# Altium schematic symbol library jlcpcb_2025_04_capacitors_extended_0201.schlib: 1175 symbols (part 6 of 7) (continued)
## GRM0335C1H820JA01D
designator C?  Capacitance: 82pF  (hidden comment: *)
Capacitor, Ceramic (MLCC), 82pF, ±5%, 50V, C0G, ±5%, SMD 0201; Manufacturer: Murata Electronics; Manufacturer Part Number: GRM0335C1H820JA01D; Package Size: 0201; JLCPCB Basic Part: No; JLCPCB Part Number: C161439; Supplier 1: LCSC; Category: Capacitors - MLCC; Supplier Part Number 1: C161439; Tolerance: ±5%; Voltage Rating: 50V; Temperature Coefficient: C0G; RoHS: Yes; ComponentLink1Description: Datasheet; ComponentLink1URL: https://wmsc.lcsc.com/wmsc/upload/file/pdf/v2/lcsc/2304140030_Murata-Electronics-GRM0335C1H820JA01D_C161439.pdf; ComponentLink2Description: JLCPCB Part URL; ComponentLink2URL: https://jlcpcb.com/partdetail/C161439; ComponentLink3Description: LCSC Part URL; ComponentLink3URL: https://lcsc.com/product-detail/Multilayer-Ceramic-Capacitors-MLCC---SMD-SMT_Murata-Electronics-Murata-Electronics-GRM0335C1H820JA01D_C161439.html
footprint CAP-0201 (0201 (0603M) Capacitor)
pins: 1, 2

## GRM0335C1H821JE01D
designator C?  Capacitance: 820pF  (hidden comment: *)
Capacitor, Ceramic (MLCC), 820pF, ±5%, null, null, ±5%, SMD 0201; Manufacturer: Murata Electronics; Manufacturer Part Number: GRM0335C1H821JE01D; Package Size: 0201; JLCPCB Basic Part: No; JLCPCB Part Number: C883565; Supplier 1: LCSC; Category: Capacitors - MLCC; Supplier Part Number 1: C883565; Tolerance: ±5%; Voltage Rating: null; Temperature Coefficient: null; RoHS: Yes; ComponentLink1Description: Datasheet; ComponentLink1URL: https://wmsc.lcsc.com/wmsc/upload/file/pdf/v2/lcsc/2304140030_Murata-Electronics-GRM0335C1H821JE01D_C883565.pdf; ComponentLink2Description: JLCPCB Part URL; ComponentLink2URL: https://jlcpcb.com/partdetail/C883565; ComponentLink3Description: LCSC Part URL; ComponentLink3URL: https://lcsc.com/product-detail/Multilayer-Ceramic-Capacitors-MLCC---SMD-SMT_Murata-Electronics-Murata-Electronics-GRM0335C1H821JE01D_C883565.html
footprint CAP-0201 (0201 (0603M) Capacitor)
pins: 1, 2

## GRM0335C1H910GA01D
designator C?  Capacitance: 91pF  (hidden comment: *)
Capacitor, Ceramic (MLCC), 91pF, ±2%, null, null, ±2%, SMD 0201; Manufacturer: Murata Electronics; Manufacturer Part Number: GRM0335C1H910GA01D; Package Size: 0201; JLCPCB Basic Part: No; JLCPCB Part Number: C710811; Supplier 1: LCSC; Category: Capacitors - MLCC; Supplier Part Number 1: C710811; Tolerance: ±2%; Voltage Rating: null; Temperature Coefficient: null; RoHS: Yes; ComponentLink1Description: Datasheet; ComponentLink1URL: https://wmsc.lcsc.com/wmsc/upload/file/pdf/v2/lcsc/2009181535_Murata-Electronics-GRM0335C1H910GA01D_C710811.pdf; ComponentLink2Description: JLCPCB Part URL; ComponentLink2URL: https://jlcpcb.com/partdetail/C710811; ComponentLink3Description: LCSC Part URL; ComponentLink3URL: https://lcsc.com/product-detail/Multilayer-Ceramic-Capacitors-MLCC---SMD-SMT_Murata-Electronics-Murata-Electronics-GRM0335C1H910GA01D_C710811.html
footprint CAP-0201 (0201 (0603M) Capacitor)
pins: 1, 2

## GRM0335C1HR20BA01D
designator C?  Capacitance: 0.2pF  (hidden comment: *)
Capacitor, Ceramic (MLCC), 0.2pF, 50V, C0G, SMD 0201; Manufacturer: Murata Electronics; Manufacturer Part Number: GRM0335C1HR20BA01D; Package Size: 0201; JLCPCB Basic Part: No; JLCPCB Part Number: C161446; Supplier 1: LCSC; Category: Capacitors - MLCC; Supplier Part Number 1: C161446; Voltage Rating: 50V; Temperature Coefficient: C0G; RoHS: Yes; ComponentLink1Description: Datasheet; ComponentLink1URL: https://wmsc.lcsc.com/wmsc/upload/file/pdf/v2/lcsc/1811081547_Murata-Electronics-GRM0335C1HR20BA01D_C161446.pdf; ComponentLink2Description: JLCPCB Part URL; ComponentLink2URL: https://jlcpcb.com/partdetail/C161446; ComponentLink3Description: LCSC Part URL; ComponentLink3URL: https://lcsc.com/product-detail/Multilayer-Ceramic-Capacitors-MLCC---SMD-SMT_Murata-Electronics-Murata-Electronics-GRM0335C1HR20BA01D_C161446.html
footprint CAP-0201 (0201 (0603M) Capacitor)
pins: 1, 2

## GRM0335C1HR20WA01D
designator C?  Capacitance: 0.2pF  (hidden comment: *)
Capacitor, Ceramic (MLCC), 0.2pF, null, null, SMD 0201; Manufacturer: Murata Electronics; Manufacturer Part Number: GRM0335C1HR20WA01D; Package Size: 0201; JLCPCB Basic Part: No; JLCPCB Part Number: C385010; Supplier 1: LCSC; Category: Capacitors - MLCC; Supplier Part Number 1: C385010; Voltage Rating: null; Temperature Coefficient: null; RoHS: Yes; ComponentLink1Description: Datasheet; ComponentLink1URL: https://wmsc.lcsc.com/wmsc/upload/file/pdf/v2/lcsc/2010302038_Murata-Electronics-GRM0335C1HR20WA01D_C385010.pdf; ComponentLink2Description: JLCPCB Part URL; ComponentLink2URL: https://jlcpcb.com/partdetail/C385010; ComponentLink3Description: LCSC Part URL; ComponentLink3URL: https://lcsc.com/product-detail/Multilayer-Ceramic-Capacitors-MLCC---SMD-SMT_Murata-Electronics-Murata-Electronics-GRM0335C1HR20WA01D_C385010.html
footprint CAP-0201 (0201 (0603M) Capacitor)
pins: 1, 2

## GRM0335C1HR30BA01D
designator C?  Capacitance: 0.3pF  (hidden comment: *)
Capacitor, Ceramic (MLCC), 0.3pF, 50V, C0G, SMD 0201; Manufacturer: Murata Electronics; Manufacturer Part Number: GRM0335C1HR30BA01D; Package Size: 0201; JLCPCB Basic Part: No; JLCPCB Part Number: C76927; Supplier 1: LCSC; Category: Capacitors - MLCC; Supplier Part Number 1: C76927; Voltage Rating: 50V; Temperature Coefficient: C0G; RoHS: Yes; ComponentLink1Description: Datasheet; ComponentLink1URL: https://wmsc.lcsc.com/wmsc/upload/file/pdf/v2/lcsc/1811081513_Murata-Electronics-GRM0335C1HR30BA01D_C76927.pdf; ComponentLink2Description: JLCPCB Part URL; ComponentLink2URL: https://jlcpcb.com/partdetail/C76927; ComponentLink3Description: LCSC Part URL; ComponentLink3URL: https://lcsc.com/product-detail/Multilayer-Ceramic-Capacitors-MLCC---SMD-SMT_Murata-Electronics-Murata-Electronics-GRM0335C1HR30BA01D_C76927.html
footprint CAP-0201 (0201 (0603M) Capacitor)
pins: 1, 2

## GRM0335C1HR30WA01D
designator C?  Capacitance: 0.3pF  (hidden comment: *)
Capacitor, Ceramic (MLCC), 0.3pF, 50V, C0G, SMD 0201; Manufacturer: Murata Electronics; Manufacturer Part Number: GRM0335C1HR30WA01D; Package Size: 0201; JLCPCB Basic Part: No; JLCPCB Part Number: C85919; Supplier 1: LCSC; Category: Capacitors - MLCC; Supplier Part Number 1: C85919; Voltage Rating: 50V; Temperature Coefficient: C0G; RoHS: Yes; ComponentLink1Description: Datasheet; ComponentLink1URL: https://wmsc.lcsc.com/wmsc/upload/file/pdf/v2/lcsc/2304140030_Murata-Electronics-GRM0335C1HR30WA01D_C85919.pdf; ComponentLink2Description: JLCPCB Part URL; ComponentLink2URL: https://jlcpcb.com/partdetail/C85919; ComponentLink3Description: LCSC Part URL; ComponentLink3URL: https://lcsc.com/product-detail/Multilayer-Ceramic-Capacitors-MLCC---SMD-SMT_Murata-Electronics-Murata-Electronics-GRM0335C1HR30WA01D_C85919.html
footprint CAP-0201 (0201 (0603M) Capacitor)
pins: 1, 2

## GRM0335C1HR40BA01D
designator C?  Capacitance: 0.4pF  (hidden comment: *)
Capacitor, Ceramic (MLCC), 0.4pF, 50V, C0G, SMD 0201; Manufacturer: Murata Electronics; Manufacturer Part Number: GRM0335C1HR40BA01D; Package Size: 0201; JLCPCB Basic Part: No; JLCPCB Part Number: C161447; Supplier 1: LCSC; Category: Capacitors - MLCC; Supplier Part Number 1: C161447; Voltage Rating: 50V; Temperature Coefficient: C0G; RoHS: Yes; ComponentLink1Description: Datasheet; ComponentLink1URL: https://wmsc.lcsc.com/wmsc/upload/file/pdf/v2/lcsc/1811081551_Murata-Electronics-GRM0335C1HR40BA01D_C161447.pdf; ComponentLink2Description: JLCPCB Part URL; ComponentLink2URL: https://jlcpcb.com/partdetail/C161447; ComponentLink3Description: LCSC Part URL; ComponentLink3URL: https://lcsc.com/product-detail/Multilayer-Ceramic-Capacitors-MLCC---SMD-SMT_Murata-Electronics-Murata-Electronics-GRM0335C1HR40BA01D_C161447.html
footprint CAP-0201 (0201 (0603M) Capacitor)
pins: 1, 2

## GRM0335C1HR40WA01D
designator C?  Capacitance: 0.4pF  (hidden comment: *)
Capacitor, Ceramic (MLCC), 0.4pF, 50V, C0G, SMD 0201; Manufacturer: Murata Electronics; Manufacturer Part Number: GRM0335C1HR40WA01D; Package Size: 0201; JLCPCB Basic Part: No; JLCPCB Part Number: C385011; Supplier 1: LCSC; Category: Capacitors - MLCC; Supplier Part Number 1: C385011; Voltage Rating: 50V; Temperature Coefficient: C0G; RoHS: Yes; ComponentLink1Description: Datasheet; ComponentLink1URL: https://wmsc.lcsc.com/wmsc/upload/file/pdf/v2/lcsc/2108182030_Murata-Electronics-GRM0335C1HR40WA01D_C385011.pdf; ComponentLink2Description: JLCPCB Part URL; ComponentLink2URL: https://jlcpcb.com/partdetail/C385011; ComponentLink3Description: LCSC Part URL; ComponentLink3URL: https://lcsc.com/product-detail/Multilayer-Ceramic-Capacitors-MLCC---SMD-SMT_Murata-Electronics-Murata-Electronics-GRM0335C1HR40WA01D_C385011.html
footprint CAP-0201 (0201 (0603M) Capacitor)
pins: 1, 2

## GRM0335C1HR50BA01D
designator C?  Capacitance: 0.5pF  (hidden comment: *)
Capacitor, Ceramic (MLCC), 0.5pF, 50V, C0G, SMD 0201; Manufacturer: Murata Electronics; Manufacturer Part Number: GRM0335C1HR50BA01D; Package Size: 0201; JLCPCB Basic Part: No; JLCPCB Part Number: C85920; Supplier 1: LCSC; Category: Capacitors - MLCC; Supplier Part Number 1: C85920; Voltage Rating: 50V; Temperature Coefficient: C0G; RoHS: Yes; ComponentLink1Description: Datasheet; ComponentLink1URL: https://wmsc.lcsc.com/wmsc/upload/file/pdf/v2/lcsc/2304140030_Murata-Electronics-GRM0335C1HR50BA01D_C85920.pdf; ComponentLink2Description: JLCPCB Part URL; ComponentLink2URL: https://jlcpcb.com/partdetail/C85920; ComponentLink3Description: LCSC Part URL; ComponentLink3URL: https://lcsc.com/product-detail/Multilayer-Ceramic-Capacitors-MLCC---SMD-SMT_Murata-Electronics-Murata-Electronics-GRM0335C1HR50BA01D_C85920.html
footprint CAP-0201 (0201 (0603M) Capacitor)
pins: 1, 2

## GRM0335C1HR50WA01D
designator C?  Capacitance: 0.5pF  (hidden comment: *)
Capacitor, Ceramic (MLCC), 0.5pF, 50V, C0G, SMD 0201; Manufacturer: Murata Electronics; Manufacturer Part Number: GRM0335C1HR50WA01D; Package Size: 0201; JLCPCB Basic Part: No; JLCPCB Part Number: C85922; Supplier 1: LCSC; Category: Capacitors - MLCC; Supplier Part Number 1: C85922; Voltage Rating: 50V; Temperature Coefficient: C0G; RoHS: Yes; ComponentLink1Description: Datasheet; ComponentLink1URL: https://wmsc.lcsc.com/wmsc/upload/file/pdf/v2/lcsc/2304140030_Murata-Electronics-GRM0335C1HR50WA01D_C85922.pdf; ComponentLink2Description: JLCPCB Part URL; ComponentLink2URL: https://jlcpcb.com/partdetail/C85922; ComponentLink3Description: LCSC Part URL; ComponentLink3URL: https://lcsc.com/product-detail/Multilayer-Ceramic-Capacitors-MLCC---SMD-SMT_Murata-Electronics-Murata-Electronics-GRM0335C1HR50WA01D_C85922.html
footprint CAP-0201 (0201 (0603M) Capacitor)
pins: 1, 2

## GRM0335C1HR60BA01D
designator C?  Capacitance: 0.6pF  (hidden comment: *)
Capacitor, Ceramic (MLCC), 0.6pF, 50V, C0G, SMD 0201; Manufacturer: Murata Electronics; Manufacturer Part Number: GRM0335C1HR60BA01D; Package Size: 0201; JLCPCB Basic Part: No; JLCPCB Part Number: C161448; Supplier 1: LCSC; Category: Capacitors - MLCC; Supplier Part Number 1: C161448; Voltage Rating: 50V; Temperature Coefficient: C0G; RoHS: Yes; ComponentLink1Description: Datasheet; ComponentLink1URL: https://wmsc.lcsc.com/wmsc/upload/file/pdf/v2/lcsc/1811081551_Murata-Electronics-GRM0335C1HR60BA01D_C161448.pdf; ComponentLink2Description: JLCPCB Part URL; ComponentLink2URL: https://jlcpcb.com/partdetail/C161448; ComponentLink3Description: LCSC Part URL; ComponentLink3URL: https://lcsc.com/product-detail/Multilayer-Ceramic-Capacitors-MLCC---SMD-SMT_Murata-Electronics-Murata-Electronics-GRM0335C1HR60BA01D_C161448.html
footprint CAP-0201 (0201 (0603M) Capacitor)
pins: 1, 2

## GRM0335C1HR60WA01D
designator C?  Capacitance: 0.6pF  (hidden comment: *)
Capacitor, Ceramic (MLCC), 0.6pF, null, null, SMD 0201; Manufacturer: Murata Electronics; Manufacturer Part Number: GRM0335C1HR60WA01D; Package Size: 0201; JLCPCB Basic Part: No; JLCPCB Part Number: C361058; Supplier 1: LCSC; Category: Capacitors - MLCC; Supplier Part Number 1: C361058; Voltage Rating: null; Temperature Coefficient: null; RoHS: Yes; ComponentLink1Description: Datasheet; ComponentLink1URL: https://wmsc.lcsc.com/wmsc/upload/file/pdf/v2/lcsc/2101081032_Murata-Electronics-GRM0335C1HR60WA01D_C361058.pdf; ComponentLink2Description: JLCPCB Part URL; ComponentLink2URL: https://jlcpcb.com/partdetail/C361058; ComponentLink3Description: LCSC Part URL; ComponentLink3URL: https://lcsc.com/product-detail/Multilayer-Ceramic-Capacitors-MLCC---SMD-SMT_Murata-Electronics-Murata-Electronics-GRM0335C1HR60WA01D_C361058.html
footprint CAP-0201 (0201 (0603M) Capacitor)
pins: 1, 2

## GRM0335C1HR70BA01D
designator C?  Capacitance: 0.7pF  (hidden comment: *)
Capacitor, Ceramic (MLCC), 0.7pF, 50V, C0G, SMD 0201; Manufacturer: Murata Electronics; Manufacturer Part Number: GRM0335C1HR70BA01D; Package Size: 0201; JLCPCB Basic Part: No; JLCPCB Part Number: C237538; Supplier 1: LCSC; Category: Capacitors - MLCC; Supplier Part Number 1: C237538; Voltage Rating: 50V; Temperature Coefficient: C0G; RoHS: Yes; ComponentLink1Description: Datasheet; ComponentLink1URL: https://wmsc.lcsc.com/wmsc/upload/file/pdf/v2/lcsc/2304140030_Murata-Electronics-GRM0335C1HR70BA01D_C237538.pdf; ComponentLink2Description: JLCPCB Part URL; ComponentLink2URL: https://jlcpcb.com/partdetail/C237538; ComponentLink3Description: LCSC Part URL; ComponentLink3URL: https://lcsc.com/product-detail/Multilayer-Ceramic-Capacitors-MLCC---SMD-SMT_Murata-Electronics-Murata-Electronics-GRM0335C1HR70BA01D_C237538.html
footprint CAP-0201 (0201 (0603M) Capacitor)
pins: 1, 2

## GRM0335C1HR70WA01D
designator C?  Capacitance: 0.7pF  (hidden comment: *)
Capacitor, Ceramic (MLCC), 0.7pF, 50V, C0G, SMD 0201; Manufacturer: Murata Electronics; Manufacturer Part Number: GRM0335C1HR70WA01D; Package Size: 0201; JLCPCB Basic Part: No; JLCPCB Part Number: C161449; Supplier 1: LCSC; Category: Capacitors - MLCC; Supplier Part Number 1: C161449; Voltage Rating: 50V; Temperature Coefficient: C0G; RoHS: Yes; ComponentLink1Description: Datasheet; ComponentLink1URL: https://wmsc.lcsc.com/wmsc/upload/file/pdf/v2/lcsc/2304140030_Murata-Electronics-GRM0335C1HR70WA01D_C161449.pdf; ComponentLink2Description: JLCPCB Part URL; ComponentLink2URL: https://jlcpcb.com/partdetail/C161449; ComponentLink3Description: LCSC Part URL; ComponentLink3URL: https://lcsc.com/product-detail/Multilayer-Ceramic-Capacitors-MLCC---SMD-SMT_Murata-Electronics-Murata-Electronics-GRM0335C1HR70WA01D_C161449.html
footprint CAP-0201 (0201 (0603M) Capacitor)
pins: 1, 2

## GRM0335C1HR75BA01D
designator C?  Capacitance: 0.75pF  (hidden comment: *)
Capacitor, Ceramic (MLCC), 0.75pF, 50V, null, SMD 0201; Manufacturer: Murata Electronics; Manufacturer Part Number: GRM0335C1HR75BA01D; Package Size: 0201; JLCPCB Basic Part: No; JLCPCB Part Number: C2171630; Supplier 1: LCSC; Category: Capacitors - MLCC; Supplier Part Number 1: C2171630; Voltage Rating: 50V; Temperature Coefficient: null; RoHS: Yes; ComponentLink1Description: Datasheet; ComponentLink1URL: https://wmsc.lcsc.com/wmsc/upload/file/pdf/v2/lcsc/2308111543_Murata-Electronics-GRM0335C1HR75BA01D_C2171630.pdf; ComponentLink2Description: JLCPCB Part URL; ComponentLink2URL: https://jlcpcb.com/partdetail/C2171630; ComponentLink3Description: LCSC Part URL; ComponentLink3URL: https://lcsc.com/product-detail/Multilayer-Ceramic-Capacitors-MLCC---SMD-SMT_Murata-Electronics-Murata-Electronics-GRM0335C1HR75BA01D_C2171630.html
footprint CAP-0201 (0201 (0603M) Capacitor)
pins: 1, 2

## GRM0335C1HR80BA01D
designator C?  Capacitance: 0.8pF  (hidden comment: *)
Capacitor, Ceramic (MLCC), 0.8pF, 50V, C0G, SMD 0201; Manufacturer: Murata Electronics; Manufacturer Part Number: GRM0335C1HR80BA01D; Package Size: 0201; JLCPCB Basic Part: No; JLCPCB Part Number: C161450; Supplier 1: LCSC; Category: Capacitors - MLCC; Supplier Part Number 1: C161450; Voltage Rating: 50V; Temperature Coefficient: C0G; RoHS: Yes; ComponentLink1Description: Datasheet; ComponentLink1URL: https://wmsc.lcsc.com/wmsc/upload/file/pdf/v2/lcsc/2304140030_Murata-Electronics-GRM0335C1HR80BA01D_C161450.pdf; ComponentLink2Description: JLCPCB Part URL; ComponentLink2URL: https://jlcpcb.com/partdetail/C161450; ComponentLink3Description: LCSC Part URL; ComponentLink3URL: https://lcsc.com/product-detail/Multilayer-Ceramic-Capacitors-MLCC---SMD-SMT_Murata-Electronics-Murata-Electronics-GRM0335C1HR80BA01D_C161450.html
footprint CAP-0201 (0201 (0603M) Capacitor)
pins: 1, 2

## GRM0335C1HR80WA01D
designator C?  Capacitance: 0.8pF  (hidden comment: *)
Capacitor, Ceramic (MLCC), 0.8pF, SMD 0201; Manufacturer: Murata Electronics; Manufacturer Part Number: GRM0335C1HR80WA01D; Package Size: 0201; JLCPCB Basic Part: No; JLCPCB Part Number: C385012; Supplier 1: LCSC; Category: Capacitors - MLCC; Supplier Part Number 1: C385012; RoHS: Yes; ComponentLink1Description: Datasheet; ComponentLink1URL: https://wmsc.lcsc.com/wmsc/upload/file/pdf/v2/lcsc/2011141507_Murata-Electronics-GRM0335C1HR80WA01D_C385012.pdf; ComponentLink2Description: JLCPCB Part URL; ComponentLink2URL: https://jlcpcb.com/partdetail/C385012; ComponentLink3Description: LCSC Part URL; ComponentLink3URL: https://lcsc.com/product-detail/Multilayer-Ceramic-Capacitors-MLCC---SMD-SMT_Murata-Electronics-Murata-Electronics-GRM0335C1HR80WA01D_C385012.html
footprint CAP-0201 (0201 (0603M) Capacitor)
pins: 1, 2

## GRM0335C1HR90WA01D
designator C?  Capacitance: 0.9pF  (hidden comment: *)
Capacitor, Ceramic (MLCC), 0.9pF, null, null, SMD 0201; Manufacturer: Murata Electronics; Manufacturer Part Number: GRM0335C1HR90WA01D; Package Size: 0201; JLCPCB Basic Part: No; JLCPCB Part Number: C385013; Supplier 1: LCSC; Category: Capacitors - MLCC; Supplier Part Number 1: C385013; Voltage Rating: null; Temperature Coefficient: null; RoHS: Yes; ComponentLink1Description: Datasheet; ComponentLink1URL: https://wmsc.lcsc.com/wmsc/upload/file/pdf/v2/lcsc/2308111631_Murata-Electronics-GRM0335C1HR90WA01D_C385013.pdf; ComponentLink2Description: JLCPCB Part URL; ComponentLink2URL: https://jlcpcb.com/partdetail/C385013; ComponentLink3Description: LCSC Part URL; ComponentLink3URL: https://lcsc.com/product-detail/Multilayer-Ceramic-Capacitors-MLCC---SMD-SMT_Murata-Electronics-Murata-Electronics-GRM0335C1HR90WA01D_C385013.html
footprint CAP-0201 (0201 (0603M) Capacitor)
pins: 1, 2

## GRM0335C2A101JA01D
designator C?  Capacitance: 100pF  (hidden comment: *)
Capacitor, Ceramic (MLCC), 100pF, ±5%, 100V, C0G, ±5%, SMD 0201; Manufacturer: Murata Electronics; Manufacturer Part Number: GRM0335C2A101JA01D; Package Size: 0201; JLCPCB Basic Part: No; JLCPCB Part Number: C161452; Supplier 1: LCSC; Category: Capacitors - MLCC; Supplier Part Number 1: C161452; Tolerance: ±5%; Voltage Rating: 100V; Temperature Coefficient: C0G; RoHS: Yes; ComponentLink1Description: Datasheet; ComponentLink1URL: https://wmsc.lcsc.com/wmsc/upload/file/pdf/v2/lcsc/2308111631_Murata-Electronics-GRM0335C2A101JA01D_C161452.pdf; ComponentLink2Description: JLCPCB Part URL; ComponentLink2URL: https://jlcpcb.com/partdetail/C161452; ComponentLink3Description: LCSC Part URL; ComponentLink3URL: https://lcsc.com/product-detail/Multilayer-Ceramic-Capacitors-MLCC---SMD-SMT_Murata-Electronics-Murata-Electronics-GRM0335C2A101JA01D_C161452.html
footprint CAP-0201 (0201 (0603M) Capacitor)
pins: 1, 2

## GRM0335C2AR20WA01D
designator C?  Capacitance: 0.2pF  (hidden comment: *)
Capacitor, Ceramic (MLCC), 0.2pF, 100V, null, SMD 0201; Manufacturer: Murata Electronics; Manufacturer Part Number: GRM0335C2AR20WA01D; Package Size: 0201; JLCPCB Basic Part: No; JLCPCB Part Number: C913492; Supplier 1: LCSC; Category: Capacitors - MLCC; Supplier Part Number 1: C913492; Voltage Rating: 100V; Temperature Coefficient: null; RoHS: Yes; ComponentLink1Description: Datasheet; ComponentLink1URL: https://wmsc.lcsc.com/wmsc/upload/file/pdf/v2/lcsc/2201131300_Murata-Electronics-GRM0335C2AR20WA01D_C913492.pdf; ComponentLink2Description: JLCPCB Part URL; ComponentLink2URL: https://jlcpcb.com/partdetail/C913492; ComponentLink3Description: LCSC Part URL; ComponentLink3URL: https://lcsc.com/product-detail/Multilayer-Ceramic-Capacitors-MLCC---SMD-SMT_Murata-Electronics-Murata-Electronics-GRM0335C2AR20WA01D_C913492.html
footprint CAP-0201 (0201 (0603M) Capacitor)
pins: 1, 2

## GRT033C71A104KE01D
designator C?  Capacitance: 100nF  (hidden comment: *)
Capacitor, Ceramic (MLCC), 100nF, ±10%, 10V, X7S, ±10%, SMD 0201; Manufacturer: Murata Electronics; Manufacturer Part Number: GRT033C71A104KE01D; Package Size: 0201; JLCPCB Basic Part: No; JLCPCB Part Number: C3845735; Supplier 1: LCSC; Category: Capacitors - MLCC; Supplier Part Number 1: C3845735; Tolerance: ±10%; Voltage Rating: 10V; Temperature Coefficient: X7S; RoHS: Yes; ComponentLink1Description: Datasheet; ComponentLink1URL: https://wmsc.lcsc.com/wmsc/upload/file/pdf/v2/lcsc/2308111522_Murata-Electronics-GRT033C71A104KE01D_C3845735.pdf; ComponentLink2Description: JLCPCB Part URL; ComponentLink2URL: https://jlcpcb.com/partdetail/C3845735; ComponentLink3Description: LCSC Part URL; ComponentLink3URL: https://lcsc.com/product-detail/Multilayer-Ceramic-Capacitors-MLCC---SMD-SMT_Murata-Electronics-Murata-Electronics-GRT033C71A104KE01D_C3845735.html
footprint CAP-0201 (0201 (0603M) Capacitor)
pins: 1, 2

## GRT033C71C104KE01D
designator C?  Capacitance: 100nF  (hidden comment: *)
Capacitor, Ceramic (MLCC), 100nF, ±10%, 16V, X7T, ±10%, SMD 0201; Manufacturer: Murata Electronics; Manufacturer Part Number: GRT033C71C104KE01D; Package Size: 0201; JLCPCB Basic Part: No; JLCPCB Part Number: C1517580; Supplier 1: LCSC; Category: Capacitors - MLCC; Supplier Part Number 1: C1517580; Tolerance: ±10%; Voltage Rating: 16V; Temperature Coefficient: X7T; RoHS: Yes; ComponentLink1Description: Datasheet; ComponentLink1URL: https://wmsc.lcsc.com/wmsc/upload/file/pdf/v2/lcsc/2111181830_Murata-Electronics-GRT033C71C104KE01D_C1517580.pdf; ComponentLink2Description: JLCPCB Part URL; ComponentLink2URL: https://jlcpcb.com/partdetail/C1517580; ComponentLink3Description: LCSC Part URL; ComponentLink3URL: https://lcsc.com/product-detail/Multilayer-Ceramic-Capacitors-MLCC---SMD-SMT_Murata-Electronics-Murata-Electronics-GRT033C71C104KE01D_C1517580.html
footprint CAP-0201 (0201 (0603M) Capacitor)
pins: 1, 2

## GRT033C80J104KE01D
designator C?  Capacitance: 100nF  (hidden comment: *)
Capacitor, Ceramic (MLCC), 100nF, ±10%, 6.3V, ±10%, SMD 0201; Manufacturer: Murata Electronics; Manufacturer Part Number: GRT033C80J104KE01D; Package Size: 0201; JLCPCB Basic Part: No; JLCPCB Part Number: C907724; Supplier 1: LCSC; Category: Capacitors - MLCC; Supplier Part Number 1: C907724; Tolerance: ±10%; Voltage Rating: 6.3V; RoHS: Yes; ComponentLink1Description: Datasheet; ComponentLink1URL: https://wmsc.lcsc.com/wmsc/upload/file/pdf/v2/lcsc/2304140030_Murata-Electronics-GRT033C80J104KE01D_C907724.pdf; ComponentLink2Description: JLCPCB Part URL; ComponentLink2URL: https://jlcpcb.com/partdetail/C907724; ComponentLink3Description: LCSC Part URL; ComponentLink3URL: https://lcsc.com/product-detail/Multilayer-Ceramic-Capacitors-MLCC---SMD-SMT_Murata-Electronics-Murata-Electronics-GRT033C80J104KE01D_C907724.html
footprint CAP-0201 (0201 (0603M) Capacitor)
pins: 1, 2

## GRT033C80J224KE01D
designator C?  Capacitance: 220nF  (hidden comment: *)
Capacitor, Ceramic (MLCC), 220nF, ±10%, 6.3V, X6S, ±10%, SMD 0201; Manufacturer: Murata Electronics; Manufacturer Part Number: GRT033C80J224KE01D; Package Size: 0201; JLCPCB Basic Part: No; JLCPCB Part Number: C711069; Supplier 1: LCSC; Category: Capacitors - MLCC; Supplier Part Number 1: C711069; Tolerance: ±10%; Voltage Rating: 6.3V; Temperature Coefficient: X6S; RoHS: Yes; ComponentLink1Description: Datasheet; ComponentLink1URL: https://wmsc.lcsc.com/wmsc/upload/file/pdf/v2/lcsc/2206281745_Murata-Electronics-GRT033C80J224KE01D_C711069.pdf; ComponentLink2Description: JLCPCB Part URL; ComponentLink2URL: https://jlcpcb.com/partdetail/C711069; ComponentLink3Description: LCSC Part URL; ComponentLink3URL: https://lcsc.com/product-detail/Multilayer-Ceramic-Capacitors-MLCC---SMD-SMT_Murata-Electronics-Murata-Electronics-GRT033C80J224KE01D_C711069.html
footprint CAP-0201 (0201 (0603M) Capacitor)
pins: 1, 2

## GRT033C81A104KE01D
designator C?  Capacitance: 100nF  (hidden comment: *)
Capacitor, Ceramic (MLCC), 100nF, ±10%, 10V, X6S, ±10%, SMD 0201; Manufacturer: Murata Electronics; Manufacturer Part Number: GRT033C81A104KE01D; Package Size: 0201; JLCPCB Basic Part: No; JLCPCB Part Number: C711070; Supplier 1: LCSC; Category: Capacitors - MLCC; Supplier Part Number 1: C711070; Tolerance: ±10%; Voltage Rating: 10V; Temperature Coefficient: X6S; RoHS: Yes; ComponentLink1Description: Datasheet; ComponentLink1URL: https://wmsc.lcsc.com/wmsc/upload/file/pdf/v2/lcsc/2210190600_Murata-Electronics-GRT033C81A104KE01D_C711070.pdf; ComponentLink2Description: JLCPCB Part URL; ComponentLink2URL: https://jlcpcb.com/partdetail/C711070; ComponentLink3Description: LCSC Part URL; ComponentLink3URL: https://lcsc.com/product-detail/Multilayer-Ceramic-Capacitors-MLCC---SMD-SMT_Murata-Electronics-Murata-Electronics-GRT033C81A104KE01D_C711070.html
footprint CAP-0201 (0201 (0603M) Capacitor)
pins: 1, 2

## GRT033C81A105ME13D
designator C?  Capacitance: 1uF  (hidden comment: *)
Capacitor, Ceramic (MLCC), 1uF, ±20%, 10V, X6S, ±20%, SMD 0201; Manufacturer: Murata Electronics; Manufacturer Part Number: GRT033C81A105ME13D; Package Size: 0201; JLCPCB Basic Part: No; JLCPCB Part Number: C2981729; Supplier 1: LCSC; Category: Capacitors - MLCC; Supplier Part Number 1: C2981729; Tolerance: ±20%; Voltage Rating: 10V; Temperature Coefficient: X6S; RoHS: Yes; ComponentLink1Description: Datasheet; ComponentLink1URL: https://wmsc.lcsc.com/wmsc/upload/file/pdf/v2/lcsc/2203210916_Murata-Electronics-GRT033C81A105ME13D_C2981729.pdf; ComponentLink2Description: JLCPCB Part URL; ComponentLink2URL: https://jlcpcb.com/partdetail/C2981729; ComponentLink3Description: LCSC Part URL; ComponentLink3URL: https://lcsc.com/product-detail/Multilayer-Ceramic-Capacitors-MLCC---SMD-SMT_Murata-Electronics-Murata-Electronics-GRT033C81A105ME13D_C2981729.html
footprint CAP-0201 (0201 (0603M) Capacitor)
pins: 1, 2

## GRT033C81E104KE01D
designator C?  Capacitance: 100nF  (hidden comment: *)
Capacitor, Ceramic (MLCC), 100nF, ±10%, 25V, X6S, ±10%, SMD 0201; Manufacturer: Murata Electronics; Manufacturer Part Number: GRT033C81E104KE01D; Package Size: 0201; JLCPCB Basic Part: No; JLCPCB Part Number: C711071; Supplier 1: LCSC; Category: Capacitors - MLCC; Supplier Part Number 1: C711071; Tolerance: ±10%; Voltage Rating: 25V; Temperature Coefficient: X6S; RoHS: Yes; ComponentLink1Description: Datasheet; ComponentLink1URL: https://wmsc.lcsc.com/wmsc/upload/file/pdf/v2/lcsc/2110281830_Murata-Electronics-GRT033C81E104KE01D_C711071.pdf; ComponentLink2Description: JLCPCB Part URL; ComponentLink2URL: https://jlcpcb.com/partdetail/C711071; ComponentLink3Description: LCSC Part URL; ComponentLink3URL: https://lcsc.com/product-detail/Multilayer-Ceramic-Capacitors-MLCC---SMD-SMT_Murata-Electronics-Murata-Electronics-GRT033C81E104KE01D_C711071.html
footprint CAP-0201 (0201 (0603M) Capacitor)
pins: 1, 2

## GRT033R60J104KE01D
designator C?  Capacitance: 100nF  (hidden comment: *)
Capacitor, Ceramic (MLCC), 100nF, ±10%, 6.3V, X5R, ±10%, SMD 0201; Manufacturer: Murata Electronics; Manufacturer Part Number: GRT033R60J104KE01D; Package Size: 0201; JLCPCB Basic Part: No; JLCPCB Part Number: C907965; Supplier 1: LCSC; Category: Capacitors - MLCC; Supplier Part Number 1: C907965; Tolerance: ±10%; Voltage Rating: 6.3V; Temperature Coefficient: X5R; RoHS: Yes; ComponentLink1Description: Datasheet; ComponentLink1URL: https://wmsc.lcsc.com/wmsc/upload/file/pdf/v2/lcsc/2304140030_Murata-Electronics-GRT033R60J104KE01D_C907965.pdf; ComponentLink2Description: JLCPCB Part URL; ComponentLink2URL: https://jlcpcb.com/partdetail/C907965; ComponentLink3Description: LCSC Part URL; ComponentLink3URL: https://lcsc.com/product-detail/Multilayer-Ceramic-Capacitors-MLCC---SMD-SMT_Murata-Electronics-Murata-Electronics-GRT033R60J104KE01D_C907965.html
footprint CAP-0201 (0201 (0603M) Capacitor)
pins: 1, 2

## GRT033R60J105ME13D
designator C?  Capacitance: 1uF  (hidden comment: *)
Capacitor, Ceramic (MLCC), 1uF, ±20%, 6.3V, X5R, ±20%, SMD 0201; Manufacturer: Murata Electronics; Manufacturer Part Number: GRT033R60J105ME13D; Package Size: 0201; JLCPCB Basic Part: No; JLCPCB Part Number: C126620; Supplier 1: LCSC; Category: Capacitors - MLCC; Supplier Part Number 1: C126620; Tolerance: ±20%; Voltage Rating: 6.3V; Temperature Coefficient: X5R; RoHS: Yes; ComponentLink1Description: Datasheet; ComponentLink1URL: https://wmsc.lcsc.com/wmsc/upload/file/pdf/v2/lcsc/1811142008_Murata-Electronics-GRT033R60J105ME13D_C126620.pdf; ComponentLink2Description: JLCPCB Part URL; ComponentLink2URL: https://jlcpcb.com/partdetail/C126620; ComponentLink3Description: LCSC Part URL; ComponentLink3URL: https://lcsc.com/product-detail/Multilayer-Ceramic-Capacitors-MLCC---SMD-SMT_Murata-Electronics-Murata-Electronics-GRT033R60J105ME13D_C126620.html
footprint CAP-0201 (0201 (0603M) Capacitor)
pins: 1, 2

## GRT033R60J473KE01D
designator C?  Capacitance: 47nF  (hidden comment: *)
Capacitor, Ceramic (MLCC), 47nF, ±10%, 6.3V, X5R, ±10%, SMD 0201; Manufacturer: Murata Electronics; Manufacturer Part Number: GRT033R60J473KE01D; Package Size: 0201; JLCPCB Basic Part: No; JLCPCB Part Number: C126621; Supplier 1: LCSC; Category: Capacitors - MLCC; Supplier Part Number 1: C126621; Tolerance: ±10%; Voltage Rating: 6.3V; Temperature Coefficient: X5R; RoHS: Yes; ComponentLink1Description: Datasheet; ComponentLink1URL: https://wmsc.lcsc.com/wmsc/upload/file/pdf/v2/lcsc/1811141821_Murata-Electronics-GRT033R60J473KE01D_C126621.pdf; ComponentLink2Description: JLCPCB Part URL; ComponentLink2URL: https://jlcpcb.com/partdetail/C126621; ComponentLink3Description: LCSC Part URL; ComponentLink3URL: https://lcsc.com/product-detail/Multilayer-Ceramic-Capacitors-MLCC---SMD-SMT_Murata-Electronics-Murata-Electronics-GRT033R60J473KE01D_C126621.html
footprint CAP-0201 (0201 (0603M) Capacitor)
pins: 1, 2

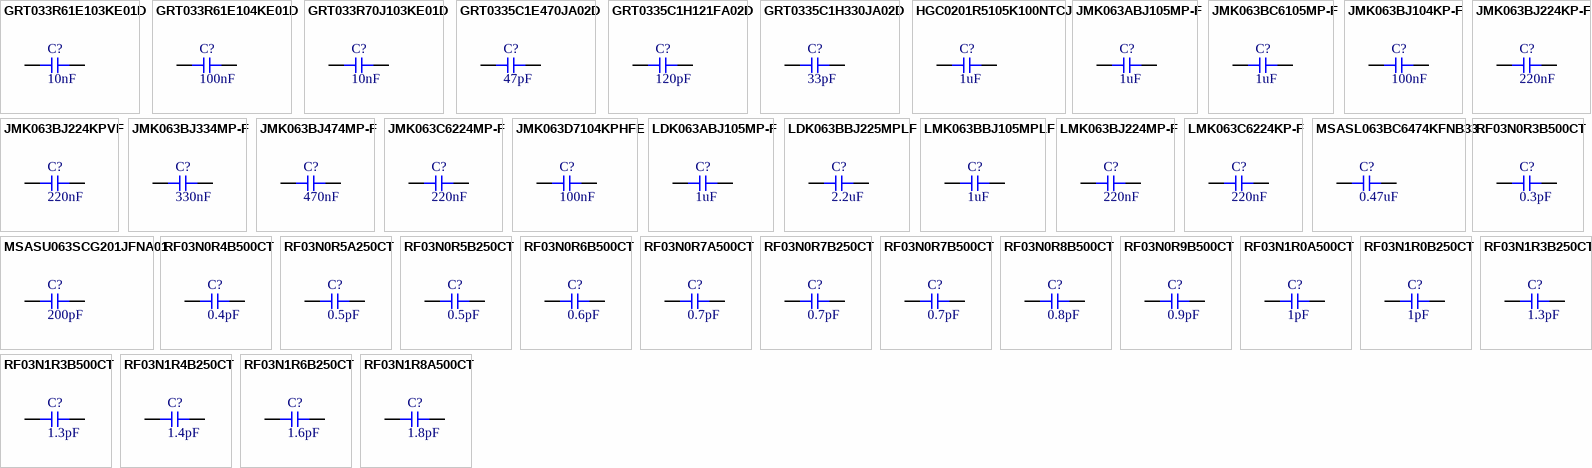
[diagram p26: symbols GRT033R61E103KE01D to RF03N1R8A500CT]

## GRT033R61E103KE01D
designator C?  Capacitance: 10nF  (hidden comment: *)
Capacitor, Ceramic (MLCC), 10nF, ±10%, 25V, X5R, ±10%, SMD 0201; Manufacturer: Murata Electronics; Manufacturer Part Number: GRT033R61E103KE01D; Package Size: 0201; JLCPCB Basic Part: No; JLCPCB Part Number: C2941934; Supplier 1: LCSC; Category: Capacitors - MLCC; Supplier Part Number 1: C2941934; Tolerance: ±10%; Voltage Rating: 25V; Temperature Coefficient: X5R; RoHS: Yes; ComponentLink1Description: Datasheet; ComponentLink1URL: https://wmsc.lcsc.com/wmsc/upload/file/pdf/v2/lcsc/2201121900_Murata-Electronics-GRT033R61E103KE01D_C2941934.pdf; ComponentLink2Description: JLCPCB Part URL; ComponentLink2URL: https://jlcpcb.com/partdetail/C2941934; ComponentLink3Description: LCSC Part URL; ComponentLink3URL: https://lcsc.com/product-detail/Multilayer-Ceramic-Capacitors-MLCC---SMD-SMT_Murata-Electronics-Murata-Electronics-GRT033R61E103KE01D_C2941934.html
footprint CAP-0201 (0201 (0603M) Capacitor)
pins: 1, 2

## GRT033R61E104KE01D
designator C?  Capacitance: 100nF  (hidden comment: *)
Capacitor, Ceramic (MLCC), 100nF, ±10%, 25V, X5R, ±10%, SMD 0201; Manufacturer: Murata Electronics; Manufacturer Part Number: GRT033R61E104KE01D; Package Size: 0201; JLCPCB Basic Part: No; JLCPCB Part Number: C915760; Supplier 1: LCSC; Category: Capacitors - MLCC; Supplier Part Number 1: C915760; Tolerance: ±10%; Voltage Rating: 25V; Temperature Coefficient: X5R; RoHS: Yes; ComponentLink1Description: Datasheet; ComponentLink1URL: https://wmsc.lcsc.com/wmsc/upload/file/pdf/v2/lcsc/2011122005_Murata-Electronics-GRT033R61E104KE01D_C915760.pdf; ComponentLink2Description: JLCPCB Part URL; ComponentLink2URL: https://jlcpcb.com/partdetail/C915760; ComponentLink3Description: LCSC Part URL; ComponentLink3URL: https://lcsc.com/product-detail/Multilayer-Ceramic-Capacitors-MLCC---SMD-SMT_Murata-Electronics-Murata-Electronics-GRT033R61E104KE01D_C915760.html
footprint CAP-0201 (0201 (0603M) Capacitor)
pins: 1, 2

## GRT033R70J103KE01D
designator C?  Capacitance: 10nF  (hidden comment: *)
Capacitor, Ceramic (MLCC), 10nF, ±10%, 6.3V, X7R, ±10%, SMD 0201; Manufacturer: Murata Electronics; Manufacturer Part Number: GRT033R70J103KE01D; Package Size: 0201; JLCPCB Basic Part: No; JLCPCB Part Number: C3039634; Supplier 1: LCSC; Category: Capacitors - MLCC; Supplier Part Number 1: C3039634; Tolerance: ±10%; Voltage Rating: 6.3V; Temperature Coefficient: X7R; RoHS: Yes; ComponentLink1Description: Datasheet; ComponentLink1URL: https://wmsc.lcsc.com/wmsc/upload/file/pdf/v2/lcsc/2206211730_Murata-Electronics-GRT033R70J103KE01D_C3039634.pdf; ComponentLink2Description: JLCPCB Part URL; ComponentLink2URL: https://jlcpcb.com/partdetail/C3039634; ComponentLink3Description: LCSC Part URL; ComponentLink3URL: https://lcsc.com/product-detail/Multilayer-Ceramic-Capacitors-MLCC---SMD-SMT_Murata-Electronics-Murata-Electronics-GRT033R70J103KE01D_C3039634.html
footprint CAP-0201 (0201 (0603M) Capacitor)
pins: 1, 2

## GRT0335C1E470JA02D
designator C?  Capacitance: 47pF  (hidden comment: *)
Capacitor, Ceramic (MLCC), 47pF, ±5%, ±5%, SMD 0201; Manufacturer: Murata Electronics; Manufacturer Part Number: GRT0335C1E470JA02D; Package Size: 0201; JLCPCB Basic Part: No; JLCPCB Part Number: C883606; Supplier 1: LCSC; Category: Capacitors - MLCC; Supplier Part Number 1: C883606; Tolerance: ±5%; RoHS: Yes; ComponentLink1Description: Datasheet; ComponentLink1URL: https://wmsc.lcsc.com/wmsc/upload/file/pdf/v2/lcsc/2304140030_Murata-Electronics-GRT0335C1E470JA02D_C883606.pdf; ComponentLink2Description: JLCPCB Part URL; ComponentLink2URL: https://jlcpcb.com/partdetail/C883606; ComponentLink3Description: LCSC Part URL; ComponentLink3URL: https://lcsc.com/product-detail/Multilayer-Ceramic-Capacitors-MLCC---SMD-SMT_Murata-Electronics-Murata-Electronics-GRT0335C1E470JA02D_C883606.html
footprint CAP-0201 (0201 (0603M) Capacitor)
pins: 1, 2

## GRT0335C1H121FA02D
designator C?  Capacitance: 120pF  (hidden comment: *)
Capacitor, Ceramic (MLCC), 120pF, ±1%, 50V, C0G, ±1%, SMD 0201; Manufacturer: Murata Electronics; Manufacturer Part Number: GRT0335C1H121FA02D; Package Size: 0201; JLCPCB Basic Part: No; JLCPCB Part Number: C3898750; Supplier 1: LCSC; Category: Capacitors - MLCC; Supplier Part Number 1: C3898750; Tolerance: ±1%; Voltage Rating: 50V; Temperature Coefficient: C0G; RoHS: Yes; ComponentLink1Description: Datasheet; ComponentLink1URL: https://wmsc.lcsc.com/wmsc/upload/file/pdf/v2/lcsc/2308111521_Murata-Electronics-GRT0335C1H121FA02D_C3898750.pdf; ComponentLink2Description: JLCPCB Part URL; ComponentLink2URL: https://jlcpcb.com/partdetail/C3898750; ComponentLink3Description: LCSC Part URL; ComponentLink3URL: https://lcsc.com/product-detail/Multilayer-Ceramic-Capacitors-MLCC---SMD-SMT_Murata-Electronics-Murata-Electronics-GRT0335C1H121FA02D_C3898750.html
footprint CAP-0201 (0201 (0603M) Capacitor)
pins: 1, 2

## GRT0335C1H330JA02D
designator C?  Capacitance: 33pF  (hidden comment: *)
Capacitor, Ceramic (MLCC), 33pF, ±5%, null, ±5%, SMD 0201; Manufacturer: Murata Electronics; Manufacturer Part Number: GRT0335C1H330JA02D; Package Size: 0201; JLCPCB Basic Part: No; JLCPCB Part Number: C782157; Supplier 1: LCSC; Category: Capacitors - MLCC; Supplier Part Number 1: C782157; Tolerance: ±5%; Voltage Rating: null; RoHS: Yes; ComponentLink1Description: Datasheet; ComponentLink1URL: https://wmsc.lcsc.com/wmsc/upload/file/pdf/v2/lcsc/2009161209_Murata-Electronics-GRT0335C1H330JA02D_C782157.pdf; ComponentLink2Description: JLCPCB Part URL; ComponentLink2URL: https://jlcpcb.com/partdetail/C782157; ComponentLink3Description: LCSC Part URL; ComponentLink3URL: https://lcsc.com/product-detail/Multilayer-Ceramic-Capacitors-MLCC---SMD-SMT_Murata-Electronics-Murata-Electronics-GRT0335C1H330JA02D_C782157.html
footprint CAP-0201 (0201 (0603M) Capacitor)
pins: 1, 2

## HGC0201R5105K100NTCJ
designator C?  Capacitance: 1uF  (hidden comment: *)
Capacitor, Ceramic (MLCC), 1uF, ±10%, 10V, X5R, ±10%, SMD 0201; Manufacturer: Chinocera; Manufacturer Part Number: HGC0201R5105K100NTCJ; Package Size: 0201; JLCPCB Basic Part: No; JLCPCB Part Number: C7432760; Supplier 1: LCSC; Category: Capacitors - MLCC; Supplier Part Number 1: C7432760; Tolerance: ±10%; Voltage Rating: 10V; Temperature Coefficient: X5R; RoHS: Yes; ComponentLink1Description: Datasheet; ComponentLink1URL: https://wmsc.lcsc.com/wmsc/upload/file/pdf/v2/lcsc/2403201121_Chinocera-HGC0201R5105K100NTCJ_C7432760.pdf; ComponentLink2Description: JLCPCB Part URL; ComponentLink2URL: https://jlcpcb.com/partdetail/C7432760; ComponentLink3Description: LCSC Part URL; ComponentLink3URL: https://lcsc.com/product-detail/Multilayer-Ceramic-Capacitors-MLCC---SMD-SMT_Chinocera-Chinocera-HGC0201R5105K100NTCJ_C7432760.html
footprint CAP-0201 (0201 (0603M) Capacitor)
pins: 1, 2

## JMK063ABJ105MP-F
designator C?  Capacitance: 1uF  (hidden comment: *)
Capacitor, Ceramic (MLCC), 1uF, ±20%, 6.3V, X5R, ±20%, SMD 0201; Manufacturer: Taiyo Yuden; Manufacturer Part Number: JMK063ABJ105MP-F; Package Size: 0201; JLCPCB Basic Part: No; JLCPCB Part Number: C87143; Supplier 1: LCSC; Category: Capacitors - MLCC; Supplier Part Number 1: C87143; Tolerance: ±20%; Voltage Rating: 6.3V; Temperature Coefficient: X5R; RoHS: Yes; ComponentLink1Description: Datasheet; ComponentLink1URL: https://wmsc.lcsc.com/wmsc/upload/file/pdf/v2/lcsc/2304140030_Taiyo-Yuden-JMK063ABJ105MP-F_C87143.pdf; ComponentLink2Description: JLCPCB Part URL; ComponentLink2URL: https://jlcpcb.com/partdetail/C87143; ComponentLink3Description: LCSC Part URL; ComponentLink3URL: https://lcsc.com/product-detail/Multilayer-Ceramic-Capacitors-MLCC---SMD-SMT_Taiyo-Yuden-Taiyo-Yuden-JMK063ABJ105MP-F_C87143.html
footprint CAP-0201 (0201 (0603M) Capacitor)
pins: 1, 2

## JMK063BC6105MP-F
designator C?  Capacitance: 1uF  (hidden comment: *)
Capacitor, Ceramic (MLCC), 1uF, ±20%, 6.3V, X6S, ±20%, SMD 0201; Manufacturer: Taiyo Yuden; Manufacturer Part Number: JMK063BC6105MP-F; Package Size: 0201; JLCPCB Basic Part: No; JLCPCB Part Number: C697613; Supplier 1: LCSC; Category: Capacitors - MLCC; Supplier Part Number 1: C697613; Tolerance: ±20%; Voltage Rating: 6.3V; Temperature Coefficient: X6S; RoHS: Yes; ComponentLink1Description: Datasheet; ComponentLink1URL: https://wmsc.lcsc.com/wmsc/upload/file/pdf/v2/lcsc/2010211034_Taiyo-Yuden-JMK063BC6105MP-F_C697613.pdf; ComponentLink2Description: JLCPCB Part URL; ComponentLink2URL: https://jlcpcb.com/partdetail/C697613; ComponentLink3Description: LCSC Part URL; ComponentLink3URL: https://lcsc.com/product-detail/Multilayer-Ceramic-Capacitors-MLCC---SMD-SMT_Taiyo-Yuden-Taiyo-Yuden-JMK063BC6105MP-F_C697613.html
footprint CAP-0201 (0201 (0603M) Capacitor)
pins: 1, 2

## JMK063BJ104KP-F
designator C?  Capacitance: 100nF  (hidden comment: *)
Capacitor, Ceramic (MLCC), 100nF, ±10%, 6.3V, X5R, ±10%, SMD 0201; Manufacturer: Taiyo Yuden; Manufacturer Part Number: JMK063BJ104KP-F; Package Size: 0201; JLCPCB Basic Part: No; JLCPCB Part Number: C89140; Supplier 1: LCSC; Category: Capacitors - MLCC; Supplier Part Number 1: C89140; Tolerance: ±10%; Voltage Rating: 6.3V; Temperature Coefficient: X5R; RoHS: Yes; ComponentLink1Description: Datasheet; ComponentLink1URL: https://wmsc.lcsc.com/wmsc/upload/file/pdf/v2/lcsc/2304140030_Taiyo-Yuden-JMK063BJ104KP-F_C89140.pdf; ComponentLink2Description: JLCPCB Part URL; ComponentLink2URL: https://jlcpcb.com/partdetail/C89140; ComponentLink3Description: LCSC Part URL; ComponentLink3URL: https://lcsc.com/product-detail/Multilayer-Ceramic-Capacitors-MLCC---SMD-SMT_Taiyo-Yuden-Taiyo-Yuden-JMK063BJ104KP-F_C89140.html
footprint CAP-0201 (0201 (0603M) Capacitor)
pins: 1, 2

## JMK063BJ224KP-F
designator C?  Capacitance: 220nF  (hidden comment: *)
Capacitor, Ceramic (MLCC), 220nF, ±10%, 6.3V, X5R, ±10%, SMD 0201; Manufacturer: Taiyo Yuden; Manufacturer Part Number: JMK063BJ224KP-F; Package Size: 0201; JLCPCB Basic Part: No; JLCPCB Part Number: C92749; Supplier 1: LCSC; Category: Capacitors - MLCC; Supplier Part Number 1: C92749; Tolerance: ±10%; Voltage Rating: 6.3V; Temperature Coefficient: X5R; RoHS: Yes; ComponentLink1Description: Datasheet; ComponentLink1URL: https://wmsc.lcsc.com/wmsc/upload/file/pdf/v2/lcsc/2105241132_Taiyo-Yuden-JMK063BJ224KP-F_C92749.pdf; ComponentLink2Description: JLCPCB Part URL; ComponentLink2URL: https://jlcpcb.com/partdetail/C92749; ComponentLink3Description: LCSC Part URL; ComponentLink3URL: https://lcsc.com/product-detail/Multilayer-Ceramic-Capacitors-MLCC---SMD-SMT_Taiyo-Yuden-Taiyo-Yuden-JMK063BJ224KP-F_C92749.html
footprint CAP-0201 (0201 (0603M) Capacitor)
pins: 1, 2

## JMK063BJ224KPVF
designator C?  Capacitance: 220nF  (hidden comment: *)
Capacitor, Ceramic (MLCC), 220nF, ±10%, 6.3V, X5R, ±10%, SMD 0201; Manufacturer: Taiyo Yuden; Manufacturer Part Number: JMK063BJ224KPVF; Package Size: 0201; JLCPCB Basic Part: No; JLCPCB Part Number: C386004; Supplier 1: LCSC; Category: Capacitors - MLCC; Supplier Part Number 1: C386004; Tolerance: ±10%; Voltage Rating: 6.3V; Temperature Coefficient: X5R; RoHS: Yes; ComponentLink1Description: Datasheet; ComponentLink2Description: JLCPCB Part URL; ComponentLink2URL: https://jlcpcb.com/partdetail/C386004; ComponentLink3Description: LCSC Part URL; ComponentLink3URL: https://lcsc.com/product-detail/Multilayer-Ceramic-Capacitors-MLCC---SMD-SMT_Taiyo-Yuden-Taiyo-Yuden-JMK063BJ224KPVF_C386004.html
footprint CAP-0201 (0201 (0603M) Capacitor)
pins: 1, 2

## JMK063BJ334MP-F
designator C?  Capacitance: 330nF  (hidden comment: *)
Capacitor, Ceramic (MLCC), 330nF, ±20%, 6.3V, X5R, ±20%, SMD 0201; Manufacturer: Taiyo Yuden; Manufacturer Part Number: JMK063BJ334MP-F; Package Size: 0201; JLCPCB Basic Part: No; JLCPCB Part Number: C2214858; Supplier 1: LCSC; Category: Capacitors - MLCC; Supplier Part Number 1: C2214858; Tolerance: ±20%; Voltage Rating: 6.3V; Temperature Coefficient: X5R; RoHS: Yes; ComponentLink1Description: Datasheet; ComponentLink1URL: https://wmsc.lcsc.com/wmsc/upload/file/pdf/v2/lcsc/2401181240_Taiyo-Yuden-JMK063BJ334MP-F_C2214858.pdf; ComponentLink2Description: JLCPCB Part URL; ComponentLink2URL: https://jlcpcb.com/partdetail/C2214858; ComponentLink3Description: LCSC Part URL; ComponentLink3URL: https://lcsc.com/product-detail/Multilayer-Ceramic-Capacitors-MLCC---SMD-SMT_Taiyo-Yuden-Taiyo-Yuden-JMK063BJ334MP-F_C2214858.html
footprint CAP-0201 (0201 (0603M) Capacitor)
pins: 1, 2

## JMK063BJ474MP-F
designator C?  Capacitance: 470nF  (hidden comment: *)
Capacitor, Ceramic (MLCC), 470nF, ±20%, 6.3V, X5R, ±20%, SMD 0201; Manufacturer: Taiyo Yuden; Manufacturer Part Number: JMK063BJ474MP-F; Package Size: 0201; JLCPCB Basic Part: No; JLCPCB Part Number: C386006; Supplier 1: LCSC; Category: Capacitors - MLCC; Supplier Part Number 1: C386006; Tolerance: ±20%; Voltage Rating: 6.3V; Temperature Coefficient: X5R; RoHS: Yes; ComponentLink1Description: Datasheet; ComponentLink1URL: https://wmsc.lcsc.com/wmsc/upload/file/pdf/v2/lcsc/2304140030_Taiyo-Yuden-JMK063BJ474MP-F_C386006.pdf; ComponentLink2Description: JLCPCB Part URL; ComponentLink2URL: https://jlcpcb.com/partdetail/C386006; ComponentLink3Description: LCSC Part URL; ComponentLink3URL: https://lcsc.com/product-detail/Multilayer-Ceramic-Capacitors-MLCC---SMD-SMT_Taiyo-Yuden-Taiyo-Yuden-JMK063BJ474MP-F_C386006.html
footprint CAP-0201 (0201 (0603M) Capacitor)
pins: 1, 2

## JMK063C6224MP-F
designator C?  Capacitance: 220nF  (hidden comment: *)
Capacitor, Ceramic (MLCC), 220nF, ±20%, 6.3V, X6S, ±20%, SMD 0201; Manufacturer: Taiyo Yuden; Manufacturer Part Number: JMK063C6224MP-F; Package Size: 0201; JLCPCB Basic Part: No; JLCPCB Part Number: C2174178; Supplier 1: LCSC; Category: Capacitors - MLCC; Supplier Part Number 1: C2174178; Tolerance: ±20%; Voltage Rating: 6.3V; Temperature Coefficient: X6S; RoHS: Yes; ComponentLink1Description: Datasheet; ComponentLink1URL: https://wmsc.lcsc.com/wmsc/upload/file/pdf/v2/lcsc/2211282000_Taiyo-Yuden-JMK063C6224MP-F_C2174178.pdf; ComponentLink2Description: JLCPCB Part URL; ComponentLink2URL: https://jlcpcb.com/partdetail/C2174178; ComponentLink3Description: LCSC Part URL; ComponentLink3URL: https://lcsc.com/product-detail/Multilayer-Ceramic-Capacitors-MLCC---SMD-SMT_Taiyo-Yuden-Taiyo-Yuden-JMK063C6224MP-F_C2174178.html
footprint CAP-0201 (0201 (0603M) Capacitor)
pins: 1, 2

## JMK063D7104KPHFE
designator C?  Capacitance: 100nF  (hidden comment: *)
Capacitor, Ceramic (MLCC), 100nF, ±10%, 6.3V, X7T, ±10%, SMD 0201; Manufacturer: Taiyo Yuden; Manufacturer Part Number: JMK063D7104KPHFE; Package Size: 0201; JLCPCB Basic Part: No; JLCPCB Part Number: C2880374; Supplier 1: LCSC; Category: Capacitors - MLCC; Supplier Part Number 1: C2880374; Tolerance: ±10%; Voltage Rating: 6.3V; Temperature Coefficient: X7T; RoHS: Yes; ComponentLink1Description: Datasheet; ComponentLink1URL: https://wmsc.lcsc.com/wmsc/upload/file/pdf/v2/lcsc/2108160930_Taiyo-Yuden-JMK063D7104KPHFE_C2880374.pdf; ComponentLink2Description: JLCPCB Part URL; ComponentLink2URL: https://jlcpcb.com/partdetail/C2880374; ComponentLink3Description: LCSC Part URL; ComponentLink3URL: https://lcsc.com/product-detail/Multilayer-Ceramic-Capacitors-MLCC---SMD-SMT_Taiyo-Yuden-Taiyo-Yuden-JMK063D7104KPHFE_C2880374.html
footprint CAP-0201 (0201 (0603M) Capacitor)
pins: 1, 2
